# Altium footprint library 3M THD.PcbLib: 163 footprints (part 9 of 14) (continued)
## 3M_N3431-5302RB [mm] "3M, 3000 Series, 34 Contacts - Pitch 2.54mm - Right Angle Four-Wall Header (Black) With Long Roll Pin Latch/Ejectors"
height 24.6
pads (36):
  round 1.6 hole 0.9: 1(-20.32,-1.27) 2(-20.32,1.27) 3(-17.78,-1.27) 4(-17.78,1.27) 5(-15.24,-1.27) 6(-15.24,1.27) 7(-12.7,-1.27) 8(-12.7,1.27) 9(-10.16,-1.27) 10(-10.16,1.27) 11(-7.62,-1.27) 12(-7.62,1.27) 13(-5.08,-1.27) 14(-5.08,1.27) 15(-2.54,-1.27) 16(-2.54,1.27) 17(0,-1.27) 18(0,1.27) 19(2.54,-1.27) 20(2.54,1.27) 21(5.08,-1.27) 22(5.08,1.27) 23(7.62,-1.27) 24(7.62,1.27) 25(10.16,-1.27) 26(10.16,1.27) 27(12.7,-1.27) 28(12.7,1.27) 29(15.24,-1.27) 30(15.24,1.27) 31(17.78,-1.27) 32(17.78,1.27) 33(20.32,-1.27) 34(20.32,1.27)
  round 4.6 hole 2.8: MTG1(-26.226,0.533) MTG2(26.232,0.533)
Top Overlay:
  circle w0.2: c25.908,6.375 r0.787
  circle w0.2: c-20.393,-3.048 r0.15
  circle w0.2: c-25.908,6.375 r0.787
  lines w0.2: -36.844,11.146 -34.266,15.612 ccw(c-34.354,15.663) -34.303,15.751 -37.218,17.433 -42.323,14.486 ccw(c-42.272,14.398) -42.323,14.31 -33.136,9.006 -30.825,6.251 ; -35.231,13.94 -29.278,10.503 ; -28.13,-2.007 -31.242,-2.007 -31.242,5.105 -27.914,14.249 -27.072,14.249 ccw(c-25.908,14.757) -24.638,14.757 -23.796,14.757 -23.354,12.251 ccw(c-22.103,12.471) -22.103,11.201 22.103,11.201 ccw(c22.103,12.471) 23.354,12.251 23.796,14.757 24.638,14.757 ccw(c25.908,14.757) 27.072,14.249 27.914,14.249 31.242,5.105 31.242,-2.007 28.13,-2.007 ; -21.584,11.201 -20.314,9.002 -19.777,9.931 ; -20.009,11.201 -20.009,9.931 -18.091,9.931 -18.098,11.201 ; -2.032,5.105 2.032,5.105 ; -2.032,11.201 -2.032,3.581 2.032,3.581 2.032,11.201 ; -1.581,5.105 -1.581,11.201 ; -0.946,5.105 -0.946,11.201 ; 0.959,5.105 0.959,11.201 ; 1.594,5.105 1.594,11.201 ; 29.278,10.503 35.231,13.94 ; 30.825,6.251 33.136,9.006 42.323,14.31 ccw(c42.272,14.398) 42.323,14.486 37.218,17.433 34.303,15.751 ccw(c34.354,15.663) 34.266,15.612 36.844,11.146
  text "34" at 19.685,2.667 h1.02
  text "1" at -22.352,-1.7 h1.02
Mechanical 14:
  circle w0.1: c26.226,0.533 r1.27
  circle w0.1: c25.908,6.375 r0.787
  circle w0.1: c-26.226,0.533 r1.27
  circle w0.1: c-25.908,6.375 r0.787
  lines w0.1: -36.844,11.146 -34.266,15.612 ccw(c-34.354,15.663) -34.303,15.751 -37.218,17.433 -42.323,14.486 ccw(c-42.272,14.398) -42.323,14.31 -33.136,9.006 -30.825,6.251 ; -35.231,13.94 -29.278,10.503 ; -28.727,-2.007 -28.727,1.978 -26.226,3.422 -23.724,1.978 -23.724,-2.007 ; -21.584,11.201 -20.314,9.002 -19.777,9.931 ; -20.009,11.201 -20.009,9.931 -18.091,9.931 -18.098,11.201 ; -2.032,5.105 2.032,5.105 ; -2.032,11.201 -2.032,3.581 2.032,3.581 2.032,11.201 ; -1.581,5.105 -1.581,11.201 ; -0.946,5.105 -0.946,11.201 ; 0.959,5.105 0.959,11.201 ; 1.594,5.105 1.594,11.201 ; 23.724,-2.007 23.724,1.978 26.226,3.422 28.727,1.978 28.727,-2.007 ; 29.278,10.503 35.231,13.94 ; 30.825,6.251 33.136,9.006 42.323,14.31 ccw(c42.272,14.398) 42.323,14.486 37.218,17.433 34.303,15.751 ccw(c34.354,15.663) 34.266,15.612 36.844,11.146 ; -31.242,-2.007 -31.242,5.105 -27.914,14.249 -27.072,14.249 ccw(c-25.908,14.757) -24.638,14.757 -23.796,14.757 -23.354,12.251 ccw(c-22.103,12.471) -22.103,11.201 22.103,11.201 ccw(c22.103,12.471) 23.354,12.251 23.796,14.757 24.638,14.757 ccw(c25.908,14.757) 27.072,14.249 27.914,14.249 31.242,5.105 31.242,-2.007 -31.242,-2.007
  text "34" at 19.685,2.667 h1.02
  text "1" at -22.352,-1.7 h1.02
3D body "3M_N3431-5302RB.stp": height 8.64, standoff -2.84, extent -42.433,-2.514 42.434,17.448

## 3M_N3431-5302RB_a [mm] "3M, 3000 Series, 34 Contacts - Pitch 2.54mm - Right Angle Four-Wall Header (Black) With Long Roll Pin Latch/Ejectors"
height 24.6
pads (36):
  round 1.6 hole 0.9: 1(-20.32,-1.27) 2(-20.32,1.27) 3(-17.78,-1.27) 4(-17.78,1.27) 5(-15.24,-1.27) 6(-15.24,1.27) 7(-12.7,-1.27) 8(-12.7,1.27) 9(-10.16,-1.27) 10(-10.16,1.27) 11(-7.62,-1.27) 12(-7.62,1.27) 13(-5.08,-1.27) 14(-5.08,1.27) 15(-2.54,-1.27) 16(-2.54,1.27) 17(0,-1.27) 18(0,1.27) 19(2.54,-1.27) 20(2.54,1.27) 21(5.08,-1.27) 22(5.08,1.27) 23(7.62,-1.27) 24(7.62,1.27) 25(10.16,-1.27) 26(10.16,1.27) 27(12.7,-1.27) 28(12.7,1.27) 29(15.24,-1.27) 30(15.24,1.27) 31(17.78,-1.27) 32(17.78,1.27) 33(20.32,-1.27) 34(20.32,1.27)
  round 4.6 hole 2.8: MTG1(-26.226,0.533) MTG2(26.232,0.533)
Top Overlay:
  circle w0.2: c25.908,6.375 r0.787
  circle w0.2: c-20.393,-3.048 r0.15
  circle w0.2: c-25.908,6.375 r0.787
  lines w0.2: -28.13,-2.007 -31.242,-2.007 -31.242,5.105 -27.914,14.249 -27.072,14.249 ccw(c-25.908,14.757) -24.638,14.757 -23.796,14.757 -23.354,12.251 ccw(c-22.103,12.471) -22.103,11.201 22.103,11.201 ccw(c22.103,12.471) 23.354,12.251 23.796,14.757 24.638,14.757 ccw(c25.908,14.757) 27.072,14.249 27.914,14.249 31.242,5.105 31.242,-2.007 28.13,-2.007 ; -27.229,14.249 -27.229,24.561 -27.076,24.649 -21.971,21.702 -21.971,18.336 -22.073,18.235 -27.229,18.235 ; -24.003,14.757 -24.003,22.875 ; -21.584,11.201 -20.314,9.002 -19.777,9.931 ; -20.009,11.201 -20.009,9.931 -18.091,9.931 -18.098,11.201 ; -2.032,5.105 2.032,5.105 ; -2.032,11.201 -2.032,3.581 2.032,3.581 2.032,11.201 ; -1.581,5.105 -1.581,11.201 ; -0.946,5.105 -0.946,11.201 ; 0.959,5.105 0.959,11.201 ; 1.594,5.105 1.594,11.201 ; 24.027,14.757 24.027,22.875 ; 27.229,14.249 27.229,24.561 27.076,24.649 21.971,21.702 21.971,18.336 22.073,18.235 27.229,18.235
  text "34" at 19.685,2.667 h1.02
  text "1" at -22.352,-1.7 h1.02
Mechanical 14:
  circle w0.1: c26.226,0.533 r1.27
  circle w0.1: c25.908,6.375 r0.787
  circle w0.1: c-26.226,0.533 r1.27
  circle w0.1: c-25.908,6.375 r0.787
  lines w0.1: -28.727,-2.007 -28.727,1.978 -26.226,3.422 -23.724,1.978 -23.724,-2.007 ; -27.229,14.249 -27.229,24.561 -27.076,24.649 -21.971,21.702 -21.971,18.336 -22.073,18.235 -27.229,18.235 ; -24.003,14.757 -24.003,22.875 ; -21.584,11.201 -20.314,9.002 -19.777,9.931 ; -20.009,11.201 -20.009,9.931 -18.091,9.931 -18.098,11.201 ; -2.032,5.105 2.032,5.105 ; -2.032,11.201 -2.032,3.581 2.032,3.581 2.032,11.201 ; -1.581,5.105 -1.581,11.201 ; -0.946,5.105 -0.946,11.201 ; 0.959,5.105 0.959,11.201 ; 1.594,5.105 1.594,11.201 ; 23.724,-2.007 23.724,1.978 26.226,3.422 28.727,1.978 28.727,-2.007 ; 24.027,14.757 24.027,22.875 ; 27.229,14.249 27.229,24.561 27.076,24.649 21.971,21.702 21.971,18.336 22.073,18.235 27.229,18.235 ; -31.242,-2.007 -31.242,5.105 -27.914,14.249 -27.072,14.249 ccw(c-25.908,14.757) -24.638,14.757 -23.796,14.757 -23.354,12.251 ccw(c-22.103,12.471) -22.103,11.201 22.103,11.201 ccw(c22.103,12.471) 23.354,12.251 23.796,14.757 24.638,14.757 ccw(c25.908,14.757) 27.072,14.249 27.914,14.249 31.242,5.105 31.242,-2.007 -31.242,-2.007
  text "34" at 19.685,2.667 h1.02
  text "1" at -22.352,-1.7 h1.02
3D body "3M_N3431-5302RB_a.stp": height 8.64, standoff -2.84, extent -31.307,-2.514 31.307,24.663

## 3M_N3431-6202RB [mm] "3M, 3000 Series, 34 Contacts - Pitch 2.54mm - Straight Four-Wall Header (Black) With Short Roll Pin Latch/Ejectors"
height 24.6
pads (36):
  round 1.6 hole 0.9: 1(-20.32,-1.27) 2(-20.32,1.27) 3(-17.78,-1.27) 4(-17.78,1.27) 5(-15.24,-1.27) 6(-15.24,1.27) 7(-12.7,-1.27) 8(-12.7,1.27) 9(-10.16,-1.27) 10(-10.16,1.27) 11(-7.62,-1.27) 12(-7.62,1.27) 13(-5.08,-1.27) 14(-5.08,1.27) 15(-2.54,-1.27) 16(-2.54,1.27) 17(0,-1.27) 18(0,1.27) 19(2.54,-1.27) 20(2.54,1.27) 21(5.08,-1.27) 22(5.08,1.27) 23(7.62,-1.27) 24(7.62,1.27) 25(10.16,-1.27) 26(10.16,1.27) 27(12.7,-1.27) 28(12.7,1.27) 29(15.24,-1.27) 30(15.24,1.27) 31(17.78,-1.27) 32(17.78,1.27) 33(20.32,-1.27) 34(20.32,1.27)
  round 4.6 hole 2.8: MTG1(-29.274,-0.254) MTG2(29.274,-0.254)
Top Overlay:
  lines w0.2: -31.242,-2 -31.242,-4.318 31.242,-4.318 31.242,-2 ; -31.242,1.7 -31.242,4.3 ; -31.242,4.318 31.242,4.318 ; -2.032,-4.318 -2.032,-3.175 ; 2.032,-4.318 2.032,-3.175 ; 31.242,1.7 31.242,4.3 ; -24.257,-3.175 24.257,-3.175 24.257,3.175 -24.257,3.175 -24.257,-3.175 ; -21.59,-3.175 -20.32,-4.318 -19.05,-3.175 -21.59,-3.175
  text "1" at -22.657,-2.921 h1.02
  text "34" at 21.555,1.727 h1.02
Mechanical 8:
  lines w0.1: -21.32,-1.27 -20.32,-1.27 ; -21.32,1.27 -20.32,1.27 ; -20.32,-2.27 -20.32,-1.27 ; -20.32,-0.27 -20.32,-1.27 ; -20.32,0.27 -20.32,1.27 ; -20.32,2.27 -20.32,1.27 ; -19.32,-1.27 -20.32,-1.27 ; -19.32,1.27 -20.32,1.27 ; -18.78,-1.27 -17.78,-1.27 ; -18.78,1.27 -17.78,1.27 ; -17.78,-2.27 -17.78,-1.27 ; -17.78,-0.27 -17.78,-1.27 ; -17.78,0.27 -17.78,1.27 ; -17.78,2.27 -17.78,1.27 ; -16.78,-1.27 -17.78,-1.27 ; -16.78,1.27 -17.78,1.27 ; -16.24,-1.27 -15.24,-1.27 ; -16.24,1.27 -15.24,1.27 ; -15.24,-2.27 -15.24,-1.27 ; -15.24,-0.27 -15.24,-1.27 ; -15.24,0.27 -15.24,1.27 ; -15.24,2.27 -15.24,1.27 ; -14.24,-1.27 -15.24,-1.27 ; -14.24,1.27 -15.24,1.27 ; -13.7,-1.27 -12.7,-1.27 ; -13.7,1.27 -12.7,1.27 ; -12.7,-2.27 -12.7,-1.27 ; -12.7,-0.27 -12.7,-1.27 ; -12.7,0.27 -12.7,1.27 ; -12.7,2.27 -12.7,1.27 ; -11.7,-1.27 -12.7,-1.27 ; -11.7,1.27 -12.7,1.27 ; -11.16,-1.27 -10.16,-1.27 ; -11.16,1.27 -10.16,1.27 ; -10.16,-2.27 -10.16,-1.27 ; -10.16,-0.27 -10.16,-1.27 ; -10.16,0.27 -10.16,1.27 ; -10.16,2.27 -10.16,1.27 ; -9.16,-1.27 -10.16,-1.27 ; -9.16,1.27 -10.16,1.27 ; -8.62,-1.27 -7.62,-1.27 ; -8.62,1.27 -7.62,1.27 ; -7.62,-2.27 -7.62,-1.27 ; -7.62,-0.27 -7.62,-1.27 ; -7.62,0.27 -7.62,1.27 ; -7.62,2.27 -7.62,1.27 ; -6.62,-1.27 -7.62,-1.27 ; -6.62,1.27 -7.62,1.27 ; -6.08,-1.27 -5.08,-1.27 ; -6.08,1.27 -5.08,1.27 ; -5.08,-2.27 -5.08,-1.27 ; -5.08,-0.27 -5.08,-1.27 ; -5.08,0.27 -5.08,1.27 ; -5.08,2.27 -5.08,1.27 ; -4.08,-1.27 -5.08,-1.27 ; -4.08,1.27 -5.08,1.27 ; -3.54,-1.27 -2.54,-1.27 ; -3.54,1.27 -2.54,1.27 ; -2.54,-2.27 -2.54,-1.27 ; -2.54,-0.27 -2.54,-1.27 ; -2.54,0.27 -2.54,1.27 ; -2.54,2.27 -2.54,1.27 ; -1.54,-1.27 -2.54,-1.27 ; -1.54,1.27 -2.54,1.27 ; -1,-1.27 0,-1.27 ; -1,0 0,0 ; -1,1.27 0,1.27 ; 0,-2.27 0,-1.27 ; 0,-1 0,0 ; 0,-0.27 0,-1.27 ; 0,0.27 0,1.27 ; 0,1 0,0 ; 0,2.27 0,1.27 ; 1,-1.27 0,-1.27 ; 1,0 0,0 ; 1,1.27 0,1.27 ; 1.54,-1.27 2.54,-1.27 ; 1.54,1.27 2.54,1.27 ; 2.54,-2.27 2.54,-1.27 ; 2.54,-0.27 2.54,-1.27 ; 2.54,0.27 2.54,1.27 ; 2.54,2.27 2.54,1.27 ; 3.54,-1.27 2.54,-1.27 ; 3.54,1.27 2.54,1.27 ; 4.08,-1.27 5.08,-1.27 ; 4.08,1.27 5.08,1.27 ; 5.08,-2.27 5.08,-1.27 ; 5.08,-0.27 5.08,-1.27 ; 5.08,0.27 5.08,1.27 ; 5.08,2.27 5.08,1.27 ; 6.08,-1.27 5.08,-1.27 ; 6.08,1.27 5.08,1.27 ; 6.62,-1.27 7.62,-1.27 ; 6.62,1.27 7.62,1.27 ; 7.62,-2.27 7.62,-1.27 ; 7.62,-0.27 7.62,-1.27 ; 7.62,0.27 7.62,1.27 ; 7.62,2.27 7.62,1.27 ; 8.62,-1.27 7.62,-1.27 ; 8.62,1.27 7.62,1.27 ; 9.16,-1.27 10.16,-1.27 ; 9.16,1.27 10.16,1.27 ; 10.16,-2.27 10.16,-1.27 ; 10.16,-0.27 10.16,-1.27 ; 10.16,0.27 10.16,1.27 ; 10.16,2.27 10.16,1.27 ; 11.16,-1.27 10.16,-1.27 ; 11.16,1.27 10.16,1.27 ; 11.7,-1.27 12.7,-1.27 ; 11.7,1.27 12.7,1.27 ; 12.7,-2.27 12.7,-1.27 ; 12.7,-0.27 12.7,-1.27 ; 12.7,0.27 12.7,1.27 ; 12.7,2.27 12.7,1.27 ; 13.7,-1.27 12.7,-1.27 ; 13.7,1.27 12.7,1.27 ; 14.24,-1.27 15.24,-1.27 ; 14.24,1.27 15.24,1.27 ; 15.24,-2.27 15.24,-1.27 ; 15.24,-0.27 15.24,-1.27 ; 15.24,0.27 15.24,1.27 ; 15.24,2.27 15.24,1.27 ; 16.24,-1.27 15.24,-1.27 ; 16.24,1.27 15.24,1.27 ; 16.78,-1.27 17.78,-1.27 ; 16.78,1.27 17.78,1.27 ; 17.78,-2.27 17.78,-1.27 ; 17.78,-0.27 17.78,-1.27 ; 17.78,0.27 17.78,1.27 ; 17.78,2.27 17.78,1.27 ; 18.78,-1.27 17.78,-1.27 ; 18.78,1.27 17.78,1.27 ; 19.32,-1.27 20.32,-1.27 ; 19.32,1.27 20.32,1.27 ; 20.32,-2.27 20.32,-1.27 ; 20.32,-0.27 20.32,-1.27 ; 20.32,0.27 20.32,1.27 ; 20.32,2.27 20.32,1.27 ; 21.32,-1.27 20.32,-1.27 ; 21.32,1.27 20.32,1.27
Mechanical 14:
  circle w0.1: c29.274,-0.254 r1.27
  circle w0.1: c-29.274,-0.254 r1.27
  lines w0.1: -31.242,-3.175 -27.914,-3.175 ; -30.274,-0.254 -29.274,-0.254 ; -29.274,-1.254 -29.274,-0.254 ; -29.274,0.746 -29.274,-0.254 ; -28.274,-0.254 -29.274,-0.254 ; -27.914,-4.318 -27.914,-1.727 -20.955,-1.727 -20.955,1.27 -27.914,1.27 -27.914,4.318 ; -27.072,-4.318 -27.072,-1.727 ; -27.072,1.27 -27.072,4.318 ; -24.639,-4.318 -24.638,-1.727 ; -24.257,-1.727 -24.257,-3.175 24.257,-3.175 24.257,-1.727 ; -24.257,1.27 -24.257,3.175 24.257,3.175 24.257,1.27 ; -17.469,-4.318 -17.469,-3.175 ; -15.551,-4.318 -15.551,-3.175 ; -2.032,-4.318 -2.032,-3.175 ; 2.032,-4.318 2.032,-3.175 ; 18.091,-4.318 18.091,-3.175 ; 20.009,-4.318 20.009,-3.175 ; 23.796,-4.318 23.796,-3.175 ; 23.796,3.175 23.796,4.318 ; 24.638,1.27 24.638,4.318 ; 24.679,-4.318 24.679,-1.727 ; 27.072,-4.318 27.072,-1.727 ; 27.072,1.27 27.072,4.318 ; 27.914,-4.318 27.914,-1.727 20.955,-1.727 20.955,1.27 27.914,1.27 27.914,4.318 ; 27.914,-3.175 31.242,-3.175 ; 27.914,3.175 31.242,3.175 ; 28.274,-0.254 29.274,-0.254 ; 29.274,-1.254 29.274,-0.254 ; 29.274,0.746 29.274,-0.254 ; 30.274,-0.254 29.274,-0.254 ; -31.242,-4.318 31.242,-4.318 31.242,4.318 -31.242,4.318 -31.242,-4.318 ; -31.242,3.175 -27.914,3.175 -31.242,3.175 ; -30.798,-1.134 -30.798,0.626 -29.274,1.506 -27.75,0.626 -27.75,-1.134 -29.274,-2.014 -30.798,-1.134 ; -24.638,1.27 -24.638,4.318 -24.638,1.27 ; -23.796,-4.318 -23.796,-3.175 -23.796,-4.318 ; -23.796,3.175 -23.796,4.318 -23.796,3.175 ; -21.59,-3.175 -20.32,-4.318 -19.05,-3.175 -21.59,-3.175 ; 27.75,-1.134 27.75,0.626 29.274,1.506 30.798,0.626 30.798,-1.134 29.274,-2.014 27.75,-1.134
  text "1" at -22.657,-2.921 h1.02
  text "34" at 21.555,1.727 h1.02
3D body "3M_N3431-6202RB.stp": height 18.69, standoff -2.84, extent -40.171,-4.318 40.171,4.318

## 3M_N3431-6202RB_a [mm] "3M, 3000 Series, 34 Contacts - Pitch 2.54mm - Straight Four-Wall Header (Black) With Short Roll Pin Latch/Ejectors"
height 24.6
pads (36):
  round 1.6 hole 0.9: 1(-20.32,-1.27) 2(-20.32,1.27) 3(-17.78,-1.27) 4(-17.78,1.27) 5(-15.24,-1.27) 6(-15.24,1.27) 7(-12.7,-1.27) 8(-12.7,1.27) 9(-10.16,-1.27) 10(-10.16,1.27) 11(-7.62,-1.27) 12(-7.62,1.27) 13(-5.08,-1.27) 14(-5.08,1.27) 15(-2.54,-1.27) 16(-2.54,1.27) 17(0,-1.27) 18(0,1.27) 19(2.54,-1.27) 20(2.54,1.27) 21(5.08,-1.27) 22(5.08,1.27) 23(7.62,-1.27) 24(7.62,1.27) 25(10.16,-1.27) 26(10.16,1.27) 27(12.7,-1.27) 28(12.7,1.27) 29(15.24,-1.27) 30(15.24,1.27) 31(17.78,-1.27) 32(17.78,1.27) 33(20.32,-1.27) 34(20.32,1.27)
  round 4.6 hole 2.8: MTG1(-29.274,-0.254) MTG2(29.274,-0.254)
Top Overlay:
  lines w0.2: -31.242,-2 -31.242,-4.318 31.242,-4.318 31.242,-2 ; -31.242,1.7 -31.242,4.3 ; -31.242,4.318 31.242,4.318 ; -2.032,-4.318 -2.032,-3.175 ; 2.032,-4.318 2.032,-3.175 ; 31.242,1.7 31.242,4.3 ; -24.257,-3.175 24.257,-3.175 24.257,3.175 -24.257,3.175 -24.257,-3.175 ; -21.59,-3.175 -20.32,-4.318 -19.05,-3.175 -21.59,-3.175
  text "1" at -22.657,-2.921 h1.02
  text "34" at 21.555,1.727 h1.02
Mechanical 8:
  lines w0.1: -21.32,-1.27 -20.32,-1.27 ; -21.32,1.27 -20.32,1.27 ; -20.32,-2.27 -20.32,-1.27 ; -20.32,-0.27 -20.32,-1.27 ; -20.32,0.27 -20.32,1.27 ; -20.32,2.27 -20.32,1.27 ; -19.32,-1.27 -20.32,-1.27 ; -19.32,1.27 -20.32,1.27 ; -18.78,-1.27 -17.78,-1.27 ; -18.78,1.27 -17.78,1.27 ; -17.78,-2.27 -17.78,-1.27 ; -17.78,-0.27 -17.78,-1.27 ; -17.78,0.27 -17.78,1.27 ; -17.78,2.27 -17.78,1.27 ; -16.78,-1.27 -17.78,-1.27 ; -16.78,1.27 -17.78,1.27 ; -16.24,-1.27 -15.24,-1.27 ; -16.24,1.27 -15.24,1.27 ; -15.24,-2.27 -15.24,-1.27 ; -15.24,-0.27 -15.24,-1.27 ; -15.24,0.27 -15.24,1.27 ; -15.24,2.27 -15.24,1.27 ; -14.24,-1.27 -15.24,-1.27 ; -14.24,1.27 -15.24,1.27 ; -13.7,-1.27 -12.7,-1.27 ; -13.7,1.27 -12.7,1.27 ; -12.7,-2.27 -12.7,-1.27 ; -12.7,-0.27 -12.7,-1.27 ; -12.7,0.27 -12.7,1.27 ; -12.7,2.27 -12.7,1.27 ; -11.7,-1.27 -12.7,-1.27 ; -11.7,1.27 -12.7,1.27 ; -11.16,-1.27 -10.16,-1.27 ; -11.16,1.27 -10.16,1.27 ; -10.16,-2.27 -10.16,-1.27 ; -10.16,-0.27 -10.16,-1.27 ; -10.16,0.27 -10.16,1.27 ; -10.16,2.27 -10.16,1.27 ; -9.16,-1.27 -10.16,-1.27 ; -9.16,1.27 -10.16,1.27 ; -8.62,-1.27 -7.62,-1.27 ; -8.62,1.27 -7.62,1.27 ; -7.62,-2.27 -7.62,-1.27 ; -7.62,-0.27 -7.62,-1.27 ; -7.62,0.27 -7.62,1.27 ; -7.62,2.27 -7.62,1.27 ; -6.62,-1.27 -7.62,-1.27 ; -6.62,1.27 -7.62,1.27 ; -6.08,-1.27 -5.08,-1.27 ; -6.08,1.27 -5.08,1.27 ; -5.08,-2.27 -5.08,-1.27 ; -5.08,-0.27 -5.08,-1.27 ; -5.08,0.27 -5.08,1.27 ; -5.08,2.27 -5.08,1.27 ; -4.08,-1.27 -5.08,-1.27 ; -4.08,1.27 -5.08,1.27 ; -3.54,-1.27 -2.54,-1.27 ; -3.54,1.27 -2.54,1.27 ; -2.54,-2.27 -2.54,-1.27 ; -2.54,-0.27 -2.54,-1.27 ; -2.54,0.27 -2.54,1.27 ; -2.54,2.27 -2.54,1.27 ; -1.54,-1.27 -2.54,-1.27 ; -1.54,1.27 -2.54,1.27 ; -1,-1.27 0,-1.27 ; -1,0 0,0 ; -1,1.27 0,1.27 ; 0,-2.27 0,-1.27 ; 0,-1 0,0 ; 0,-0.27 0,-1.27 ; 0,0.27 0,1.27 ; 0,1 0,0 ; 0,2.27 0,1.27 ; 1,-1.27 0,-1.27 ; 1,0 0,0 ; 1,1.27 0,1.27 ; 1.54,-1.27 2.54,-1.27 ; 1.54,1.27 2.54,1.27 ; 2.54,-2.27 2.54,-1.27 ; 2.54,-0.27 2.54,-1.27 ; 2.54,0.27 2.54,1.27 ; 2.54,2.27 2.54,1.27 ; 3.54,-1.27 2.54,-1.27 ; 3.54,1.27 2.54,1.27 ; 4.08,-1.27 5.08,-1.27 ; 4.08,1.27 5.08,1.27 ; 5.08,-2.27 5.08,-1.27 ; 5.08,-0.27 5.08,-1.27 ; 5.08,0.27 5.08,1.27 ; 5.08,2.27 5.08,1.27 ; 6.08,-1.27 5.08,-1.27 ; 6.08,1.27 5.08,1.27 ; 6.62,-1.27 7.62,-1.27 ; 6.62,1.27 7.62,1.27 ; 7.62,-2.27 7.62,-1.27 ; 7.62,-0.27 7.62,-1.27 ; 7.62,0.27 7.62,1.27 ; 7.62,2.27 7.62,1.27 ; 8.62,-1.27 7.62,-1.27 ; 8.62,1.27 7.62,1.27 ; 9.16,-1.27 10.16,-1.27 ; 9.16,1.27 10.16,1.27 ; 10.16,-2.27 10.16,-1.27 ; 10.16,-0.27 10.16,-1.27 ; 10.16,0.27 10.16,1.27 ; 10.16,2.27 10.16,1.27 ; 11.16,-1.27 10.16,-1.27 ; 11.16,1.27 10.16,1.27 ; 11.7,-1.27 12.7,-1.27 ; 11.7,1.27 12.7,1.27 ; 12.7,-2.27 12.7,-1.27 ; 12.7,-0.27 12.7,-1.27 ; 12.7,0.27 12.7,1.27 ; 12.7,2.27 12.7,1.27 ; 13.7,-1.27 12.7,-1.27 ; 13.7,1.27 12.7,1.27 ; 14.24,-1.27 15.24,-1.27 ; 14.24,1.27 15.24,1.27 ; 15.24,-2.27 15.24,-1.27 ; 15.24,-0.27 15.24,-1.27 ; 15.24,0.27 15.24,1.27 ; 15.24,2.27 15.24,1.27 ; 16.24,-1.27 15.24,-1.27 ; 16.24,1.27 15.24,1.27 ; 16.78,-1.27 17.78,-1.27 ; 16.78,1.27 17.78,1.27 ; 17.78,-2.27 17.78,-1.27 ; 17.78,-0.27 17.78,-1.27 ; 17.78,0.27 17.78,1.27 ; 17.78,2.27 17.78,1.27 ; 18.78,-1.27 17.78,-1.27 ; 18.78,1.27 17.78,1.27 ; 19.32,-1.27 20.32,-1.27 ; 19.32,1.27 20.32,1.27 ; 20.32,-2.27 20.32,-1.27 ; 20.32,-0.27 20.32,-1.27 ; 20.32,0.27 20.32,1.27 ; 20.32,2.27 20.32,1.27 ; 21.32,-1.27 20.32,-1.27 ; 21.32,1.27 20.32,1.27
Mechanical 14:
  circle w0.1: c29.274,-0.254 r1.27
  circle w0.1: c-29.274,-0.254 r1.27
  lines w0.1: -31.242,-3.175 -27.914,-3.175 ; -30.274,-0.254 -29.274,-0.254 ; -29.274,-1.254 -29.274,-0.254 ; -29.274,0.746 -29.274,-0.254 ; -28.274,-0.254 -29.274,-0.254 ; -27.914,-4.318 -27.914,-1.727 -20.955,-1.727 -20.955,1.27 -27.914,1.27 -27.914,4.318 ; -27.072,-4.318 -27.072,-1.727 ; -27.072,1.27 -27.072,4.318 ; -24.639,-4.318 -24.638,-1.727 ; -24.257,-1.727 -24.257,-3.175 24.257,-3.175 24.257,-1.727 ; -24.257,1.27 -24.257,3.175 24.257,3.175 24.257,1.27 ; -17.469,-4.318 -17.469,-3.175 ; -15.551,-4.318 -15.551,-3.175 ; -2.032,-4.318 -2.032,-3.175 ; 2.032,-4.318 2.032,-3.175 ; 18.091,-4.318 18.091,-3.175 ; 20.009,-4.318 20.009,-3.175 ; 23.796,-4.318 23.796,-3.175 ; 23.796,3.175 23.796,4.318 ; 24.638,1.27 24.638,4.318 ; 24.679,-4.318 24.679,-1.727 ; 27.072,-4.318 27.072,-1.727 ; 27.072,1.27 27.072,4.318 ; 27.914,-4.318 27.914,-1.727 20.955,-1.727 20.955,1.27 27.914,1.27 27.914,4.318 ; 27.914,-3.175 31.242,-3.175 ; 27.914,3.175 31.242,3.175 ; 28.274,-0.254 29.274,-0.254 ; 29.274,-1.254 29.274,-0.254 ; 29.274,0.746 29.274,-0.254 ; 30.274,-0.254 29.274,-0.254 ; -31.242,-4.318 31.242,-4.318 31.242,4.318 -31.242,4.318 -31.242,-4.318 ; -31.242,3.175 -27.914,3.175 -31.242,3.175 ; -30.798,-1.134 -30.798,0.626 -29.274,1.506 -27.75,0.626 -27.75,-1.134 -29.274,-2.014 -30.798,-1.134 ; -24.638,1.27 -24.638,4.318 -24.638,1.27 ; -23.796,-4.318 -23.796,-3.175 -23.796,-4.318 ; -23.796,3.175 -23.796,4.318 -23.796,3.175 ; -21.59,-3.175 -20.32,-4.318 -19.05,-3.175 -21.59,-3.175 ; 27.75,-1.134 27.75,0.626 29.274,1.506 30.798,0.626 30.798,-1.134 29.274,-2.014 27.75,-1.134
  text "1" at -22.657,-2.921 h1.02
  text "34" at 21.555,1.727 h1.02
3D body "3M_N3431-6202RB_a.stp": height 24.64, standoff -2.84, extent -31.242,-4.318 31.242,4.318

## 3M_N3431-6302RB [mm] "3M, 3000 Series, 34 Contacts - Pitch 2.54mm - Straight Four-Wall Header (Black) With Long Roll Pin Latch/Ejectors"
height 27.2
pads (36):
  round 1.6 hole 0.9: 1(-20.32,-1.27) 2(-20.32,1.27) 3(-17.78,-1.27) 4(-17.78,1.27) 5(-15.24,-1.27) 6(-15.24,1.27) 7(-12.7,-1.27) 8(-12.7,1.27) 9(-10.16,-1.27) 10(-10.16,1.27) 11(-7.62,-1.27) 12(-7.62,1.27) 13(-5.08,-1.27) 14(-5.08,1.27) 15(-2.54,-1.27) 16(-2.54,1.27) 17(0,-1.27) 18(0,1.27) 19(2.54,-1.27) 20(2.54,1.27) 21(5.08,-1.27) 22(5.08,1.27) 23(7.62,-1.27) 24(7.62,1.27) 25(10.16,-1.27) 26(10.16,1.27) 27(12.7,-1.27) 28(12.7,1.27) 29(15.24,-1.27) 30(15.24,1.27) 31(17.78,-1.27) 32(17.78,1.27) 33(20.32,-1.27) 34(20.32,1.27)
  round 4.6 hole 2.8: MTG1(-29.274,-0.254) MTG2(29.274,-0.254)
Top Overlay:
  lines w0.2: -31.242,-2 -31.242,-4.318 31.242,-4.318 31.242,-2 ; -31.242,1.7 -31.242,4.3 ; -31.242,4.318 31.242,4.318 ; -2.032,-4.318 -2.032,-3.175 ; 2.032,-4.318 2.032,-3.175 ; 31.242,1.7 31.242,4.3 ; -24.257,-3.175 -24.257,3.175 24.257,3.175 24.257,-3.175 -24.257,-3.175 ; -21.59,-3.175 -19.05,-3.175 -20.32,-4.318 -21.59,-3.175
  text "34" at 21.555,1.727 h1.02
  text "1" at -22.657,-2.921 h1.02
Mechanical 8:
  lines w0.1: -21.32,-1.27 -20.32,-1.27 ; -21.32,1.27 -20.32,1.27 ; -20.32,-2.27 -20.32,-1.27 ; -20.32,-0.27 -20.32,-1.27 ; -20.32,0.27 -20.32,1.27 ; -20.32,2.27 -20.32,1.27 ; -19.32,-1.27 -20.32,-1.27 ; -19.32,1.27 -20.32,1.27 ; -18.78,-1.27 -17.78,-1.27 ; -18.78,1.27 -17.78,1.27 ; -17.78,-2.27 -17.78,-1.27 ; -17.78,-0.27 -17.78,-1.27 ; -17.78,0.27 -17.78,1.27 ; -17.78,2.27 -17.78,1.27 ; -16.78,-1.27 -17.78,-1.27 ; -16.78,1.27 -17.78,1.27 ; -16.24,-1.27 -15.24,-1.27 ; -16.24,1.27 -15.24,1.27 ; -15.24,-2.27 -15.24,-1.27 ; -15.24,-0.27 -15.24,-1.27 ; -15.24,0.27 -15.24,1.27 ; -15.24,2.27 -15.24,1.27 ; -14.24,-1.27 -15.24,-1.27 ; -14.24,1.27 -15.24,1.27 ; -13.7,-1.27 -12.7,-1.27 ; -13.7,1.27 -12.7,1.27 ; -12.7,-2.27 -12.7,-1.27 ; -12.7,-0.27 -12.7,-1.27 ; -12.7,0.27 -12.7,1.27 ; -12.7,2.27 -12.7,1.27 ; -11.7,-1.27 -12.7,-1.27 ; -11.7,1.27 -12.7,1.27 ; -11.16,-1.27 -10.16,-1.27 ; -11.16,1.27 -10.16,1.27 ; -10.16,-2.27 -10.16,-1.27 ; -10.16,-0.27 -10.16,-1.27 ; -10.16,0.27 -10.16,1.27 ; -10.16,2.27 -10.16,1.27 ; -9.16,-1.27 -10.16,-1.27 ; -9.16,1.27 -10.16,1.27 ; -8.62,-1.27 -7.62,-1.27 ; -8.62,1.27 -7.62,1.27 ; -7.62,-2.27 -7.62,-1.27 ; -7.62,-0.27 -7.62,-1.27 ; -7.62,0.27 -7.62,1.27 ; -7.62,2.27 -7.62,1.27 ; -6.62,-1.27 -7.62,-1.27 ; -6.62,1.27 -7.62,1.27 ; -6.08,-1.27 -5.08,-1.27 ; -6.08,1.27 -5.08,1.27 ; -5.08,-2.27 -5.08,-1.27 ; -5.08,-0.27 -5.08,-1.27 ; -5.08,0.27 -5.08,1.27 ; -5.08,2.27 -5.08,1.27 ; -4.08,-1.27 -5.08,-1.27 ; -4.08,1.27 -5.08,1.27 ; -3.54,-1.27 -2.54,-1.27 ; -3.54,1.27 -2.54,1.27 ; -2.54,-2.27 -2.54,-1.27 ; -2.54,-0.27 -2.54,-1.27 ; -2.54,0.27 -2.54,1.27 ; -2.54,2.27 -2.54,1.27 ; -1.54,-1.27 -2.54,-1.27 ; -1.54,1.27 -2.54,1.27 ; -1,-1.27 0,-1.27 ; -1,0 0,0 ; -1,1.27 0,1.27 ; 0,-2.27 0,-1.27 ; 0,-1 0,0 ; 0,-0.27 0,-1.27 ; 0,0.27 0,1.27 ; 0,1 0,0 ; 0,2.27 0,1.27 ; 1,-1.27 0,-1.27 ; 1,0 0,0 ; 1,1.27 0,1.27 ; 1.54,-1.27 2.54,-1.27 ; 1.54,1.27 2.54,1.27 ; 2.54,-2.27 2.54,-1.27 ; 2.54,-0.27 2.54,-1.27 ; 2.54,0.27 2.54,1.27 ; 2.54,2.27 2.54,1.27 ; 3.54,-1.27 2.54,-1.27 ; 3.54,1.27 2.54,1.27 ; 4.08,-1.27 5.08,-1.27 ; 4.08,1.27 5.08,1.27 ; 5.08,-2.27 5.08,-1.27 ; 5.08,-0.27 5.08,-1.27 ; 5.08,0.27 5.08,1.27 ; 5.08,2.27 5.08,1.27 ; 6.08,-1.27 5.08,-1.27 ; 6.08,1.27 5.08,1.27 ; 6.62,-1.27 7.62,-1.27 ; 6.62,1.27 7.62,1.27 ; 7.62,-2.27 7.62,-1.27 ; 7.62,-0.27 7.62,-1.27 ; 7.62,0.27 7.62,1.27 ; 7.62,2.27 7.62,1.27 ; 8.62,-1.27 7.62,-1.27 ; 8.62,1.27 7.62,1.27 ; 9.16,-1.27 10.16,-1.27 ; 9.16,1.27 10.16,1.27 ; 10.16,-2.27 10.16,-1.27 ; 10.16,-0.27 10.16,-1.27 ; 10.16,0.27 10.16,1.27 ; 10.16,2.27 10.16,1.27 ; 11.16,-1.27 10.16,-1.27 ; 11.16,1.27 10.16,1.27 ; 11.7,-1.27 12.7,-1.27 ; 11.7,1.27 12.7,1.27 ; 12.7,-2.27 12.7,-1.27 ; 12.7,-0.27 12.7,-1.27 ; 12.7,0.27 12.7,1.27 ; 12.7,2.27 12.7,1.27 ; 13.7,-1.27 12.7,-1.27 ; 13.7,1.27 12.7,1.27 ; 14.24,-1.27 15.24,-1.27 ; 14.24,1.27 15.24,1.27 ; 15.24,-2.27 15.24,-1.27 ; 15.24,-0.27 15.24,-1.27 ; 15.24,0.27 15.24,1.27 ; 15.24,2.27 15.24,1.27 ; 16.24,-1.27 15.24,-1.27 ; 16.24,1.27 15.24,1.27 ; 16.78,-1.27 17.78,-1.27 ; 16.78,1.27 17.78,1.27 ; 17.78,-2.27 17.78,-1.27 ; 17.78,-0.27 17.78,-1.27 ; 17.78,0.27 17.78,1.27 ; 17.78,2.27 17.78,1.27 ; 18.78,-1.27 17.78,-1.27 ; 18.78,1.27 17.78,1.27 ; 19.32,-1.27 20.32,-1.27 ; 19.32,1.27 20.32,1.27 ; 20.32,-2.27 20.32,-1.27 ; 20.32,-0.27 20.32,-1.27 ; 20.32,0.27 20.32,1.27 ; 20.32,2.27 20.32,1.27 ; 21.32,-1.27 20.32,-1.27 ; 21.32,1.27 20.32,1.27
Mechanical 14:
  circle w0.1: c-29.274,-0.254 r1.27
  circle w0.1: c29.274,-0.254 r1.27
  lines w0.1: -31.242,-3.175 -27.914,-3.175 ; -30.274,-0.254 -29.274,-0.254 ; -29.274,-1.254 -29.274,-0.254 ; -29.274,0.746 -29.274,-0.254 ; -28.274,-0.254 -29.274,-0.254 ; -27.914,-4.318 -27.914,-1.727 -20.955,-1.727 -20.955,1.27 -27.914,1.27 -27.914,4.318 ; -27.072,-4.318 -27.072,-1.727 ; -27.072,1.27 -27.072,4.318 ; -24.639,-4.318 -24.638,-1.727 ; -24.257,-1.727 -24.257,-3.175 24.257,-3.175 24.257,-1.727 ; -24.257,1.27 -24.257,3.175 24.257,3.175 24.257,1.27 ; -17.469,-4.318 -17.469,-3.175 ; -15.551,-4.318 -15.551,-3.175 ; -2.032,-4.318 -2.032,-3.175 ; 2.032,-4.318 2.032,-3.175 ; 18.091,-4.318 18.091,-3.175 ; 20.009,-4.318 20.009,-3.175 ; 23.796,-4.318 23.796,-3.175 ; 23.796,3.175 23.796,4.318 ; 24.638,1.27 24.638,4.318 ; 24.679,-4.318 24.679,-1.727 ; 27.072,-4.318 27.072,-1.727 ; 27.072,1.27 27.072,4.318 ; 27.914,-4.318 27.914,-1.727 20.955,-1.727 20.955,1.27 27.914,1.27 27.914,4.318 ; 27.914,-3.175 31.242,-3.175 ; 27.914,3.175 31.242,3.175 ; 28.274,-0.254 29.274,-0.254 ; 29.274,-1.254 29.274,-0.254 ; 29.274,0.746 29.274,-0.254 ; 30.274,-0.254 29.274,-0.254 ; -31.242,-4.318 -31.242,4.318 31.242,4.318 31.242,-4.318 -31.242,-4.318 ; -31.242,3.175 -27.914,3.175 -31.242,3.175 ; -30.798,-1.134 -29.274,-2.014 -27.75,-1.134 -27.75,0.626 -29.274,1.506 -30.798,0.626 -30.798,-1.134 ; -24.638,1.27 -24.638,4.318 -24.638,1.27 ; -23.796,-4.318 -23.796,-3.175 -23.796,-4.318 ; -23.796,3.175 -23.796,4.318 -23.796,3.175 ; -21.59,-3.175 -19.05,-3.175 -20.32,-4.318 -21.59,-3.175 ; 27.75,-1.134 29.274,-2.014 30.798,-1.134 30.798,0.626 29.274,1.506 27.75,0.626 27.75,-1.134
  text "34" at 21.555,1.727 h1.02
  text "1" at -22.657,-2.921 h1.02
3D body "3M_N3431-6302RB.stp": height 19.96, standoff -2.84, extent -42.369,-4.318 42.369,4.318